# Altium footprint library 杂项开关等.PcbLib: 45 footprints (part 2 of 3)
Each footprint in its own frame and in the unit in brackets; x right, y up, seen from the top. Pads: shape width x height; smd on the part's side, far side on the other; paste and mask are expansions set on the pad; w line width, h text height; cw(c..) or ccw(c..) is an arc to the next point about the centre after c.
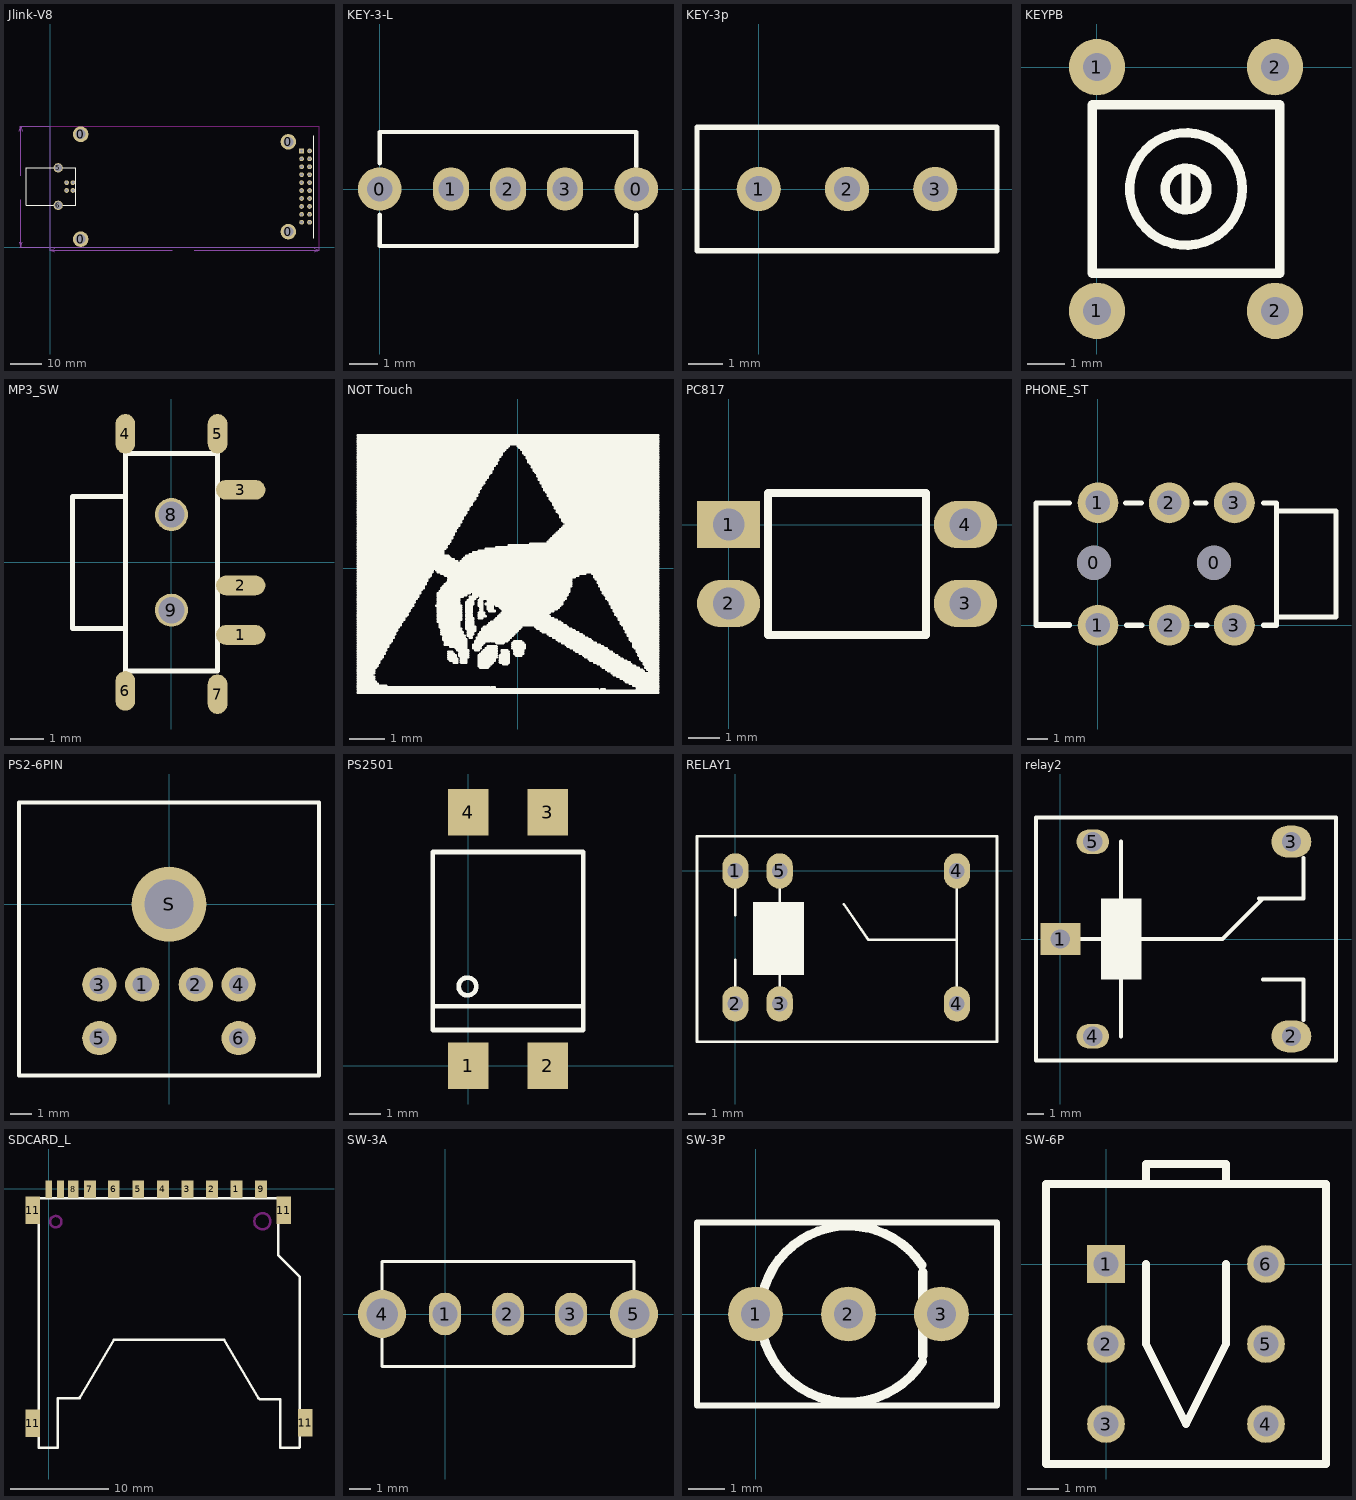
[diagram p1: the footprints below, top view; thin cyan lines are the x and y axes]

## Jlink-V8 [mil]
pads (30):
  round 196.85 hole 125.98: 0(385.5,101.11) 0(385.5,1423.94) 0(3003.61,195.6) 0(3003.61,1328.47)
  round 60 hole 36.22: 1(287,715) 2(287,813.42) 3(208.26,813.42) 4(208.26,715)
  rect 60x60 hole 36: 1(3171,1214)
  round 60 hole 36: 2(3271,1214) 3(3171,1114) 4(3271,1114) 5(3171,1014) 6(3271,1014) 7(3171,914) 8(3271,914) 9(3171,814) 10(3271,814) 11(3171,714) 12(3271,714) 13(3171,614) 14(3271,614) 15(3171,514) 16(3271,514) 17(3171,414) 18(3271,414) 19(3171,314) 20(3271,314)
  round 118.11 hole 94.49: 5(101.96,1000.43) 6(101.96,527.99)
Top Overlay:
  lines w10: -303.55,527.99 -303.55,1000.43 326.37,1000.43 326.37,527.99 -303.55,527.99
  lines w15: 3006.76,1244.76 3006.76,1248.24 ; 3326,115 3326,1407
Keep-Out Layer:
  lines w3.94: 0,1523 0,0 3390,0 3390,1523 1,1523
Mechanical 1:
  lines w3.94: -392,60 -372,0 ; -392,1463 -372,1523 ; -382,0 -11.97,0 ; -382,1523 -10.97,1523 ; -372,597 -372,0 ; -372,898.91 -372,1523 ; -352,60 -372,0 ; -352,1463 -372,1523 ; 0,-46 0,-11.97 ; 60,-56 0,-36 ; 60,-16 0,-36 ; 1543.04,-36 0,-36 ; 1814.96,-36 3390,-36 ; 3330,-56 3390,-36 ; 3330,-16 3390,-36 ; 3390,-46 3390,-11.97
  text "38.68" at -369,613 h60
  text "86.11" at 1559.04,-71.99 h60

## KEY-3-L [mil]
pads (5):
  round 60 hole 35: 0(0,0) 0(354.33,0)
  oval 50x60 hole 35: 1(98.43,0) 2(177.17,0) 3(255.91,0)
Top Overlay:
  lines w6: 0,-35.43 0,-78.74 354.33,-78.74 354.33,-35.43 ; 0,35.43 0,78.74 354.33,78.74 354.33,39.37 354.33,31.5

## KEY-3p [mil]
pads (3):
  round 50 hole 30: 1(0,0) 2(100,0) 3(200,0)
Top Overlay:
  lines w6: -70,-70 270,-70 270,70 -70,70 -70,-70

## KEYPB [mil]
pads (4):
  round 60 hole 30: 1(0,-260) 1(0,0) 2(190,-260) 2(190,0)
Top Overlay:
  circle w10: c95,-130 r60
  circle w10: c95,-130 r22.36
  lines w10: 95,-150 95,-110 ; -5,-220 -5,-40 195,-40 195,-220 -5,-220

## MP3_SW [mm]
pads (9):
  oval 1.5x0.6 smd: 1(2.1,-2.2) 2(2.1,-0.7) 3(2.1,2.2)
  oval 0.6x1.2 smd: 4(-1.4,3.9) 5(1.4,3.9) 6(-1.4,-3.9) 7(1.4,-4)
  round 1 hole 0.8: 8(0,1.45) 9(0,-1.45)
Top Overlay:
  lines w0.152: -1.4,-2 -3,-2 -3,2 -1.4,2 ; -1.4,-3.3 1,-3.3 1.4,-3.3 1.4,3.3 -1.4,3.3 -1.4,-3.3

## NOT Touch [mm]
Top Overlay:
  drawing of 472 lines, arcs and shapes, not listed

## PC817 [mil]
pads (4):
  rect 80x60 hole 40: 1(0,0)
  oval 80x60 hole 40: 2(0,-100) 3(300,-100) 4(300,0)
Top Overlay:
  lines w10: 50,-140 250,-140 250,40 50,40 50,-140

## PHONE_ST [mm]
pads (8):
  round 1.676 hole 1.676: 0(-0.2,3.06) 0(5.7,3.06)
  round 2 hole 1.2: 1(0,0) 1(0,6) 2(3.5,0) 2(3.5,6) 3(6.7,0) 3(6.7,6)
Top Overlay:
  lines w0.254: -3.043,0.031 -1.392,0.031 ; -1.392,-0.007 -3.043,-0.007 -3.043,6 -1.392,6 ; 1.364,6 2.126,6 ; 1.402,-0.007 2.164,-0.007 ; 4.793,6 5.301,6 ; 4.831,-0.007 5.339,-0.007 ; 8.133,-0.007 8.68,-0.007 ; 8.133,6 8.768,6 8.768,-0.007 ; 8.768,0.4 11.689,0.4 11.689,5.6 8.768,5.6

## PS2-6PIN [mm]
pads (7):
  round 1.6 hole 0.9: 1(-1.25,-3.75) 2(1.25,-3.75) 3(-3.25,-3.75) 4(3.25,-3.75) 5(-3.25,-6.25) 6(3.25,-6.25)
  round 3.5 hole 2.3: S(0,0)
Top Overlay:
  lines w0.2: -7,-8 7,-8 7,4.75 -7,4.75 -7,-8

## PS2501 [mm]
pads (4):
  rect 1.3x1.5 smd: 1(0,0) 2(2.54,0) 3(2.54,8.128) 4(0,8.128)
Top Overlay:
  circle w0.152: c-0.03,2.54 r0.284
  lines w0.152: -1.143,1.905 3.683,1.905 ; -1.143,1.143 -1.143,6.858 3.683,6.858 3.683,1.143 -1.143,1.143

## RELAY1 [mm]
pads (6):
  oval 1.5x2.032 hole 0.9: 1(0,0) 2(0,-7.62) 3(2.54,-7.62) 4(12.7,-7.62) 4(12.7,0) 5(2.54,0)
Top Overlay:
  rectangle: 1.016,-5.969 3.937,-1.778
  lines w0.152: 0,-6.731 0,-5.08 ; 0,-2.54 0,-0.889 ; 2.54,-6.731 2.54,-1.905 2.54,-0.889 ; 6.223,-1.905 7.62,-3.937 12.7,-3.937 ; 12.7,-6.731 12.7,-0.762 ; -2.2,-9.8 15,-9.8 15,2 -2.2,2 -2.2,0.168 -2.2,-9.8

## relay2 [mil]
pads (5):
  rect 98.43x78.74 hole 47.24: 1(0,0)
  oval 98.43x78.74 hole 47.24: 2(570,-240) 3(570,240)
  oval 80x60 hole 47.24: 4(80,-240) 5(80,240)
Top Overlay:
  rectangle: 100,-100 200,100
  lines w10: 40,0 310,0 ; 150,-240 150,-100 ; 150,100 150,240 ; 300,0 400,0 500,100 ; 490,100 600,100 600,200 ; 500,-100 600,-100 600,-200 ; -60,-300 680,-300 680,300 -60,300 -60,10 -60,-300

## SDCARD_L [mm]
pads (15):
  rect 1.2x1.8 smd: 1(19.075,-0.051) 2(16.586,-0.051) 3(14.092,-0.06) 4(11.592,-0.06) 5(9.092,-0.06) 6(6.592,-0.06) 7(4.167,-0.06) 9(21.592,-0.06)
  rect 1.1x1.8 smd: 8(2.464,-0.051)
  rect 0.7x1.8 smd: 10(1.167,-0.06) 12(-0.025,-0.051)
  rect 1.5x2.8 smd: 11(-1.651,-23.885) 11(-1.651,-2.194) 11(23.901,-2.194) 11(26.086,-23.834)
Top Overlay:
  lines w0.254: 0.917,-21.351 0.917,-26.351 -1.055,-26.351 -1.055,-0.965 -1.041,-0.951 23.317,-0.951 23.317,-6.761 25.507,-8.95 25.517,-8.95 25.517,-26.324 25.49,-26.351 23.517,-26.351 23.517,-21.452 21.475,-21.452 21.317,-21.294 ; 0.968,-21.345 3.01,-21.345 3.168,-21.187 ; 3.117,-21.345 6.629,-15.351 ; 6.617,-15.351 17.817,-15.351 21.317,-21.345
Keep-Out Layer:
  circle w0.254: c0.686,-3.351 r0.58
  circle w0.254: c21.717,-3.311 r0.82

## SW-3A [mil]
pads (5):
  oval 60x80 hole 47.24: 1(0,0) 2(118.11,0) 3(236.22,0)
  round 90 hole 59.06: 4(-118.11,0) 5(354.33,0)
Top Overlay:
  lines w6: -118.11,-98.43 -118.11,98.43 354.33,98.43 354.33,-98.43 -118.11,-98.43

## SW-3P [mm]
pads (3):
  round 1.5 hole 0.8: 1(0,0) 2(2.54,0) 3(5.08,0)
Top Overlay:
  lines w0.152: -1.6,-2.5 -1.6,2.5 6.6,2.5 6.6,-2.5 -1.6,-2.5
  lines w0.254: 4.545,1.337 ccw(c2.54,0) 4.563,-1.309 ; 4.572,-1.143 4.572,1.143

## SW-6P [mm]
pads (6):
  rect 1.2x1.2 hole 0.8: 1(0,0)
  round 1.2 hole 0.8: 2(0,-2.54) 3(0,-5.08) 4(5.08,-5.08) 5(5.08,-2.54) 6(5.08,0)
Top Overlay:
  lines w0.254: 1.27,0 1.27,-2.54 2.54,-5.08 3.81,-2.54 3.81,0 ; 1.27,2.54 1.27,3.175 3.81,3.175 3.81,2.54 ; -1.905,-6.35 -1.905,2.54 6.985,2.54 6.985,-6.35 -1.905,-6.35